# Altium schematic symbol library Hydra_Ref_sch.SCHLIB: 791 symbols (part 1 of 5)
Pins are listed as number, name and electrical type; pins without a type are passive.

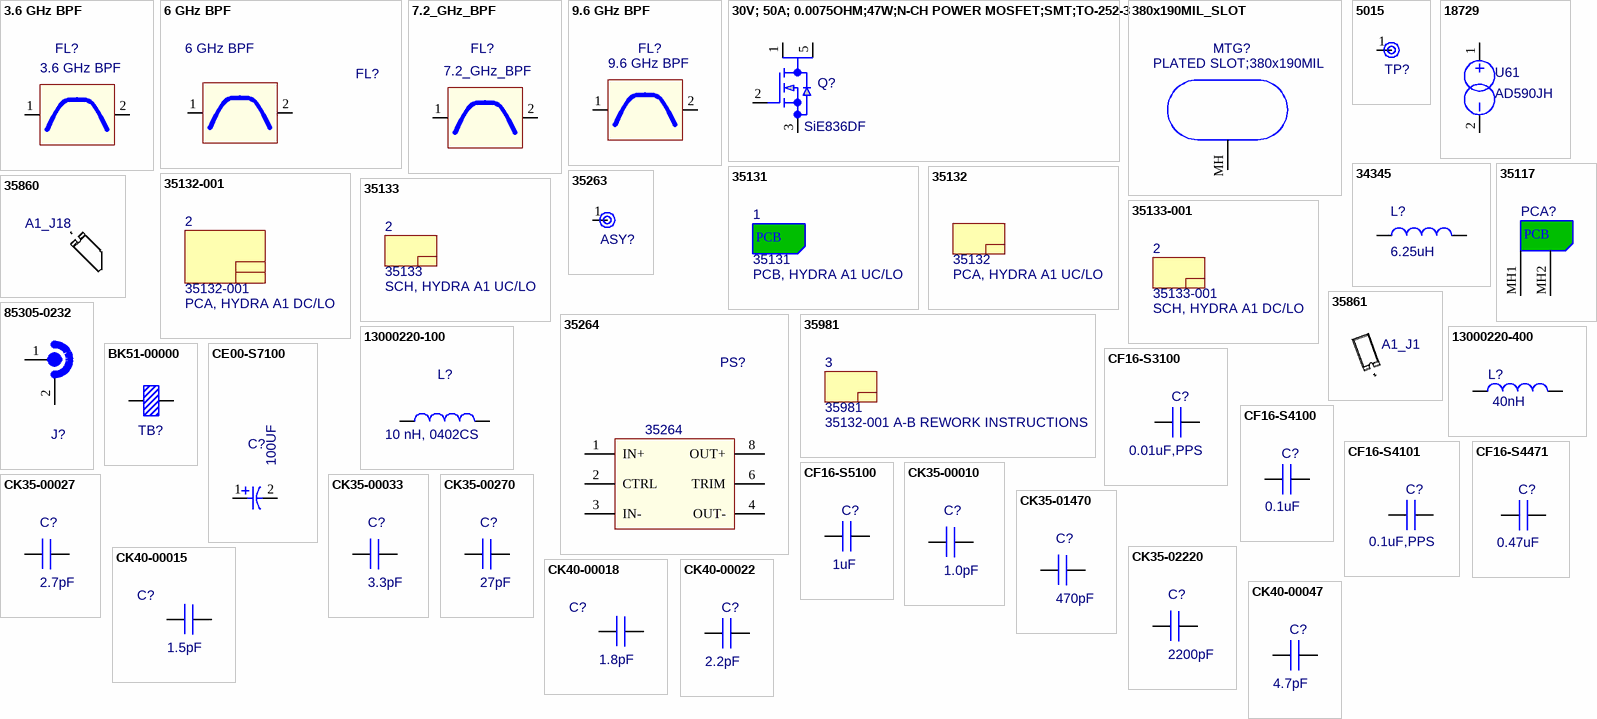
[diagram p0: symbols 3.6 GHz BPF to CK40-00047]

## 3.6 GHz BPF
designator FL?, comment value 3.6 GHz BPF  (hidden comment: MICROSTRIP BPF, 3 TO 4.2 GHz)  (net tie, no BOM)
Approved: CL; NoLoad: .; level: 1; MFGR: N/A; ModifyDate: 5/30/13; M_PN: N/A; G_PN: N/A
footprint 3.6 GHz BPF
footprint 3.6_GHz_BPF
pins: 1 IN, 2 OUT
1 alternate drawing of the same symbol

## 6 GHz BPF
designator FL?  value 6 GHz BPF  (no BOM)
Approved: CL; NoLoad: .; level: 1; MFGR: N/A; ModifyDate: 6/2/13; M_PN: N/A; G_PN: N/A
footprint 6_GHz_BPF_2013-09-30
footprint 6_GHz_BPF_2013-09-30_ALT
pins: 1 IN, 2 OUT
1 alternate drawing of the same symbol

## 7.2_GHz_BPF
designator FL?, comment value 7.2_GHz_BPF  (hidden comment: MICROSTRIP BPF, 7.2 GHz)  (no BOM)
Approved: CL; NoLoad: .; level: 1; MFGR: N/A; ModifyDate: 6/2/13; M_PN: N/A; G_PN: N/A
footprint 7200_MHz_BPF
pins: 1 IN, 2 OUT
1 alternate drawing of the same symbol

## 9.6 GHz BPF
designator FL?  value 9.6 GHz BPF  (no BOM)
Approved: CL; NoLoad: .; level: 1; MFGR: N/A; ModifyDate: 6/2/13; M_PN: N/A; G_PN: N/A
footprint 9.6 GHz_BPF
footprint 9.6_GHz_BPF
pins: 1 IN, 2 OUT
1 alternate drawing of the same symbol

## 30V; 50A; 0.0075OHM;47W;N-CH POWER MOSFET;SMT;TO-252-3
designator Q?, comment M_PN: SiE836DF  (hidden comment: 200V;104W;18.3A;10V VGS ON ;.13 OHM RDS;POLARPAK SMT)
G_PN: QMPP-07503; NoLoad: .; Approved: NM; MFGR: INFINEON; level: 1; ModifyDate: 5/6/13; item_number: QMPP-07503
footprint MOS-SIE836DF (MOSFET)
pins: 1 S, 2 G, 3 D, 5 S

## 380x190MIL_SLOT
designator MTG?, comment PLATED SLOT;380x190MIL  (no BOM)
level: 1; NoLoad: N/L
footprint PLATED SLOT-380x190MIL (PLATED SLOT;380x190MIL)
footprint PLATED_SLOT-380x190MIL
pins: MH

## 5015
designator TP?, comment PCB TEST POINT; SMT; 0.105 x 0.040  (value not drawn)
Value: 5015; MFGR: KEYSTONE; NoLoad: .; Approved: CL; level: 1; M_PN: 5015; ModifyDate: 3/10/12
footprint TP-105x40 (SMT TEST POINT, PAD .105"x.040")
pins: 1

## 18729
designator U61, comment M_PN: AD590JH  (hidden comment: IC; 2-Terminal; Temperature Transducer)
G_PN: 18729; NoLoad: .; Approved: NM; MFGR: ANALOG DEVICES; level: 1; line_number: 1260; ModifyDate: 12/06/12; item_number: 18729
footprint TO-52 (Temperature Transducer, Analog Devices, AD590)
pins: 1 +, 2 -

## 34345
designator L?, comment value 6.25uH  (hidden comment: INDUCTOR;TOROID;6.25 uH;20% @10MHz;.135 OD CORE)
MFGR: GOWANDA; NoLoad: .; Approved: CL; G_PN: 34345; M_PN: custom; level: 1; ModifyDate: 02/22/12; item_number: 34345
footprint IND-TOROIDAL-34345 (.135x.050 toroidan inductor G_PN 34345)
pins: 1, 2

## 35117
designator PCA?  (no BOM)
HYDRA A1-A3 BOARD PCA; level: 1
footprint 35117 (HYDRA A1-A3 BOARD PCA)
pins: MH1 "mounting hole", MH2
text: PCB

## 35131
designator 1  value PCB, HYDRA A1 UC/LO  (hidden comment: 35131)  (mechanical)
PCB, HYDRA A1 UC/LO; NoLoad: .; MFGR: STREAMLINE CIRCUITS; Approved: MH; level: 1; M_PN: 35131; ModifyDate: 2016-03-18; line_number: 1; item_number: 35131
text: PCB

## 35132
designator ?  value PCA, HYDRA A1 UC/LO  item_number: 35132  (mechanical)
PCA, HYDRA A1 UC/LO; NoLoad: .; level: 0; line_number: 0

## 35132-001
designator 2  value PCA, HYDRA A1 DC/LO  (hidden comment: 35132-001)
PCA, HYDRA A1 DC/LO; NoLoad: .; level: 1; item_number: 35132-001; G_PN: 35132-001

## 35133
designator 2  value SCH, HYDRA A1 UC/LO  (hidden comment: 35133)  (mechanical)
SCH, HYDRA A1 UC/LO; NoLoad: .; level: 1; line_number: 2; item_number: 35133

## 35133-001
designator 2  value SCH, HYDRA A1 DC/LO  (hidden comment: 35133-001)  (mechanical)
SCH, HYDRA A1 DC/LO; NoLoad: .; level: 1; line_number: 2; item_number: 35133-001

## 35263
designator ASY?, comment ASSY,HYDRA A2-A1 SHOCK MOUNTED OSCILLATOR  (value not drawn)
Value: 35263; NoLoad: .; Approved: CL; level: 1; ModifyDate: 3/10/12
footprint OCXO assy (Assy only)
footprint OCXO ASSY-NO DIM
footprint OCXO_ASSY
pins: 1

## 35264
designator PS?, comment G_PN: 35264  (hidden comment: ZP00-01502 (DC-DC Converter) Assembly)
MFGR: Giga-tronics; Approved: CL; NoLoad: .; Value: 35264; level: 1; ModifyDate: 5/26/12; M_PN: 35264; item_number: 35264
footprint CONV-ULS-15/2-D48N-C (1.3x0.9x.036" convetor -muRata)
footprint CONV-ULS-15_2-D48N-C
pins: 1 IN+, 2 CTRL, 3 IN-, 4 OUT-, 6 TRIM, 8 OUT+

## 35860
designator A1_J18  (mechanical)
SHIELD,HYDRA,A1-J18; MFGR: Any; Approved: MH; NoLoad: .; G_PN: 35860; Value: 35860; level: 1; ModifyDate: 08/28/15; M_PN: Any; item_number: 35860
footprint 35860 (SHIELD,HYDRA,A1-J18)

## 35861
designator A1_J1  (mechanical)
SHIELD,HYDRA,A1-J1; MFGR: Any; Approved: MH; NoLoad: .; G_PN: 35861; Value: 35861; level: 1; ModifyDate: 08/28/15; M_PN: Any; item_number: 35861
footprint 35861 (SHIELD,HYDRA,A1-J1)

## 35981
designator 3  value 35132-001 A-B REWORK INSTRUCTIONS  (hidden comment: 35981)  (mechanical)
35132-001 A-B REWORK INSTRUCTIONS; NoLoad: .; level: 1; line_number: 3; item_number: 35981

## 85305-0232
designator J?  (value not drawn)
SMB;M;PCB;.197X.197X.161;SURF MT; MFGR: MOLEX; Approved: CL; NoLoad: .; level: 1; Value: 85305-0232; M_PN: 85305-0232; ModifyDate: 4/5/12
footprint CONN-85305-0232 (SMP PLUG SMT MOLEX)
pins: 1 CNTR, 2 GND

## 13000220-100
designator L?, comment value 10 nH, 0402CS  (hidden comment: INDUCTOR,10 NH SM 0402 PKG)
MFGR: Coilcraft; NoLoad: .; Approved: NM; M_PN: 0402CS-10NXGLU; G_PN: 13000220-100; level: 1; ModifyDate: 11/17/12; item_number: 13000220-100
footprint IND-0402-RF (0402 COILCRAFT IND)
pins: 1, 2

## 13000220-400
designator L?, comment value 40nH  (hidden comment: INDUCTOR,40 NH SM 0402 PKG)
G_PN: 13000220-400; M_PN: 0402CS-40NXGLU; MFGR: COILCRAFT; NoLoad: .; Approved: CL; level: 1; ModifyDate: 7/2/13; item_number: 13000220-400
footprint IND-0402CS (Coilcraft 0402CS SM Inductor 47X25X26(mil))
pins: 1, 2

## BK51-00000
designator TB?, comment THERMAL BRIDGE, AlN, 1010  (value not drawn)
G_PN: BK51-00000; Approved: CL; NoLoad: .; MFGR: ANY; M_PN: BT31010WA; level: 1; ModifyDate: 6-28-13; Value: N/A; item_number: BK51-00000
footprint TB-1010-N (METRIC 3225)
pins: 1, 2

## CE00-S7100
designator C?  value 100UF  (hidden comment: CE00-S7100)
CAP ALUM 100UF 100V 20% SMD; NoLoad: .; M_PN: EEVFK2A101M; level: 1; ModifyDate: KS; G_PN: CE00-S7100; item_number: CE00-S7100
footprint CAPB3528-REVA_CT20-S6221[RF-1]()
footprint CAP-FK-TYPE-V
pins: 1 POS, 2 NEG

## CF16-S3100
designator C?, comment value 0.01uF,PPS  (hidden comment: 01UF; 5%; 16V;STACKED METALLIZED PPS FILM;0805)
G_PN: CF16-S3100; Approved: CL; NoLoad: .; MFGR: PANASONIC; M_PN: ECH-U1C103JX5; level: 1; ModifyDate: 03/26/12; item_number: CF16-S3100
footprint CAP-0805-N
pins: 1, 2

## CF16-S4100
designator C?, comment value 0.1uF  (hidden comment: .1UF;5%;16V;STACKED METALIZED PPS FILM;1210)
G_PN: CF16-S4100; Approved: CL; NoLoad: .; MFGR: PANASONIC; M_PN: ECH-U1C104JX5; level: 1; ModifyDate: 4/11/12; item_number: CF16-S4100
footprint CAP-1210-N
pins: 1, 2

## CF16-S4101
designator C?, comment value 0.1uF,PPS  (hidden comment: .1UF;20%;16V;LOW ESR;STACKED METALLIZED PLASTIC FILM;0805)
G_PN: CF16-S4101; Approved: CL; NoLoad: .; MFGR: PANASONIC; M_PN: ECP-U1C104MA5; level: 1; ModifyDate: 4/11/12; item_number: CF16-S4101
footprint CAP-0805-N
pins: 1, 2

## CF16-S4471
designator C?, comment value 0.47uF  (hidden comment: .47UF;20%;16V;METALLIZED PPS FILM; SMT;1206)
NoLoad: .; G_PN: CF16-S4471; MFGR: PANASONIC; Approved: CL; M_PN: ECP-U1C474MA5; level: 1; ModifyDate: 4/11/12; item_number: CF16-S4471
footprint CAP-1206-N (CAP, 1206)
pins: 1, 2

## CF16-S5100
designator C?, comment value 1uF  (hidden comment: 1UF; 20%; 16V; PPS FILM; SMT; 1210)
NoLoad: .; G_PN: CF16-S5100; M_PN: ECP-U1C105MA5; MFGR: PANASONIC; Approved: CL; level: 1; ModifyDate: 02/22/12; item_number: CF16-S5100
footprint CAP-1210-N (METRIC 3225)
pins: 1, 2

## CK35-00010
designator C?, comment value 1.0pF  (hidden comment: 1.0pF;5%;COG;50V;CHIP;0201)
G_PN: CK35-00010; Approved: CL; NoLoad: .; MFGR: VENKEL; M_PN: C0201C0G500-1R0BNP; level: 1; ModifyDate: 7/23/13; item_number: CK35-00010
footprint CAP-0201-N (Metric 1005)
pins: 1, 2

## CK35-00027
designator C?, comment value 2.7pF  (hidden comment: 2.7pF;5%;COG;50V;CHIP;0201)
G_PN: CK35-00027; Approved: CL; NoLoad: .; MFGR: VENKEL; M_PN: C0201C0G500-2R7BNP; level: 1; ModifyDate: 6/13/13; item_number: CK35-00027
footprint CAP-0201-N (Metric 1005)
pins: 1, 2

## CK35-00033
designator C?, comment value 3.3pF  (hidden comment: 3.3pF;5%;COG;50V;CHIP;0201)
G_PN: CK35-00033; Approved: CL; NoLoad: .; MFGR: VENKEL; M_PN: C0201C0G500-3R3BNP; level: 1; ModifyDate: 6/24/13; item_number: CK35-00033
footprint CAP-0201-N (Metric 1005)
pins: 1, 2

## CK35-00270
designator C?, comment value 27pF  (hidden comment: 27 PF,5% TOL;C0G;50V,CHIP;0201)
G_PN: CK35-00270; Approved: CL; NoLoad: .; MFGR: VENKEL; M_PN: C0201C0G500-270JNP; level: 1; ModifyDate: 8/2/13; item_number: CK35-00270
footprint CAP-0201-N (Metric 1005)
pins: 1, 2

## CK35-01470
designator C?, comment value 470pF  (hidden comment: 470 PF,+/-5%;X7R;25V,CHIP;0201)
G_PN: CK35-01470; Approved: CL; NoLoad: .; MFGR: VENKEL; M_PN: C0201X7R250-471JNP; level: 1; ModifyDate: 7/23/13; item_number: CK35-01470
footprint CAP-0201-N (Metric 1005)
pins: 1, 2

## CK35-02220
designator C?, comment value 2200pF  (hidden comment: 2200 PF,+/-5%;X7R;25V,CHIP;0201)
G_PN: CK35-02220; Approved: CL; NoLoad: .; MFGR: VENKEL; M_PN: C0201X7R250-222JNP; level: 1; ModifyDate: 7/23/13; item_number: CK35-02220
footprint CAP-0201-N (Metric 1005)
pins: 1, 2

## CK40-00015
designator C?, comment value 1.5pF  (hidden comment: 1.5pF;5%;COG;50V;CHIP;0402)
G_PN: CK40-00015; Approved: NM; NoLoad: .; MFGR: ANY; level: 1; ModifyDate: 04/06/12; M_PN: ANY; item_number: CK40-00015
footprint CAP-0402-N (0402 Footprint)
pins: 1, 2

## CK40-00018
designator C?, comment value 1.8pF  (hidden comment: 1.8pF;5%;COG;50V;CHIP;0402)
G_PN: CK40-00018; Approved: NM; NoLoad: .; MFGR: ANY; level: 1; ModifyDate: 09/19/12; M_PN: ANY; item_number: CK40-00018
footprint CAP-0402-N (0402 Footprint)
pins: 1, 2

## CK40-00022
designator C?, comment value 2.2pF  (hidden comment: 2.2pF;5%;COG;50V;CHIP;0402)
G_PN: CK40-00022; Approved: CL; NoLoad: .; MFGR: ANY; level: 1; ModifyDate: 04/11/12; M_PN: ANY; item_number: CK40-00022
footprint CAP-0402-N (0402 Footprint)
pins: 1, 2

## CK40-00047
designator C?, comment value 4.7pF  (hidden comment: 4.7pF;5%;COG;50V;CHIP;0402)
MFGR: ANY; Approved: CL; NoLoad: .; G_PN: CK40-00047; level: 1; ModifyDate: 3/24/12; M_PN: ANY; item_number: CK40-00047
footprint CAP-0402-N (0402 Footprint)
pins: 1, 2

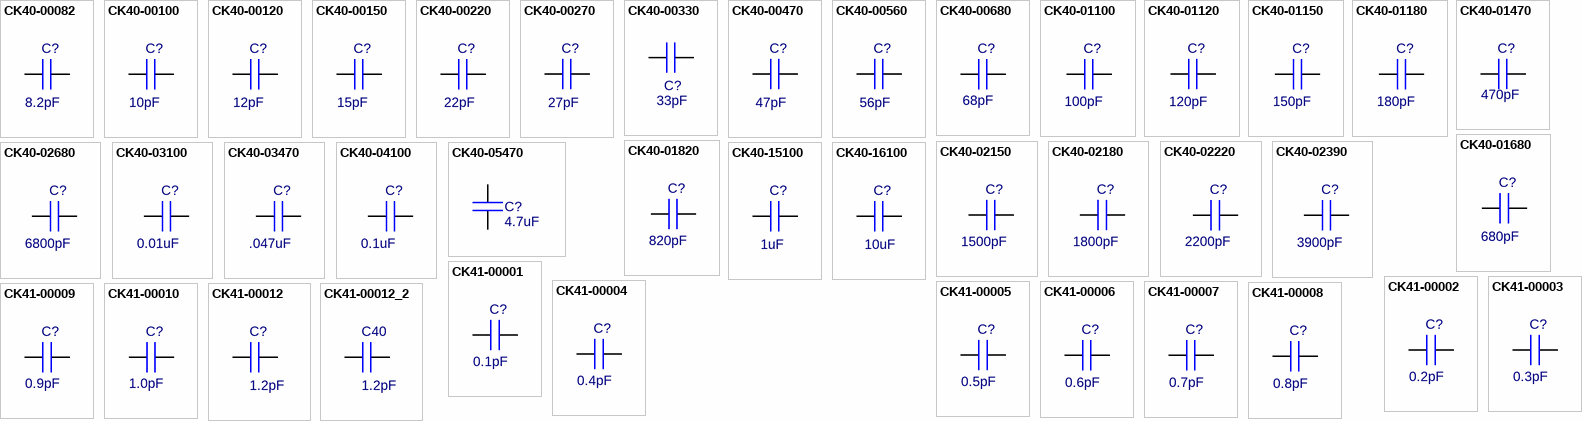
[diagram p1: symbols CK40-00082 to CK41-00012_2]

## CK40-00082
designator C?, comment value 8.2pF  (hidden comment: 8.2 PF,+/-0.25pF;C0G;50V,CHIP;0402)
MFGR: ANY; Approved: NM; NoLoad: .; G_PN: CK40-00082; level: 1; ModifyDate: 11/12/12; M_PN: ANY; item_number: CK40-00082
footprint CAP-0402-N (0402 Footprint)
pins: 1, 2

## CK40-00100
designator C?, comment value 10pF  (hidden comment: 10 PF;5%;COG;>50V;CHIP;0402)
G_PN: CK40-00100; NoLoad: .; MFGR: ANY; Approved: CL; level: 1; ModifyDate: 4/9/12; M_PN: ANY; item_number: CK40-00100
footprint CAP-0402-N (0402 Footprint)
pins: 1, 2

## CK40-00120
designator C?, comment value 12pF  (hidden comment: 12 PF;5%;COG;>50V;CHIP;0402)
G_PN: CK40-00120; NoLoad: .; MFGR: ANY; Approved: CL; level: 1; ModifyDate: 10/06/12; M_PN: ANY; item_number: CK40-00120
footprint CAP-0402-N (0402 Footprint)
pins: 1, 2

## CK40-00150
designator C?, comment value 15pF  (hidden comment: 15 PF;5%;COG;>50V;CHIP;0402)
MFGR: ANY; Approved: CL; NoLoad: .; G_PN: CK40-00150; level: 1; ModifyDate: 4/9/12; M_PN: ANY; item_number: CK40-00150
footprint CAP-0402-N (0402 Footprint)
pins: 1, 2

## CK40-00220
designator C?, comment value 22pF  (hidden comment: 22 PF;5%;COG;>50V;CHIP;0402)
G_PN: CK40-00220; Approved: CL; NoLoad: .; MFGR: ANY; level: 1; ModifyDate: 02/22/12; M_PN: ANY; item_number: CK40-00220
footprint CAP-0402-N (0402 Footprint)
pins: 1, 2

## CK40-00270
designator C?, comment value 27pF  (hidden comment: 27 PF;5%;COG;>50V;CHIP;0402)
G_PN: CK40-00270; Approved: CL; MFGR: ANY; NoLoad: .; level: 1; ModifyDate: 02/22/12; M_PN: ANY; item_number: CK40-00270
footprint CAP-0402-N (0402 Footprint)
pins: 1, 2

## CK40-00330
designator C?, comment value 33pF  (hidden comment: 33 PF;5%;COG;>50V;CHIP;0402)
G_PN: CK40-00330; Approved: CL; MFGR: ANY; NoLoad: .; level: 1; ModifyDate: 3/9/13; M_PN: ANY; item_number: CK40-00330
footprint CAP-0402-N (0402 Footprint)
pins: 1, 2

## CK40-00470
designator C?, comment value 47pF  (hidden comment: 47pF;5%;COG;50V;CHIP;0402)
G_PN: CK40-00470; Approved: NM; NoLoad: .; MFGR: ANY; level: 1; ModifyDate: 04/06/12; M_PN: ANY; item_number: CK40-00470
footprint CAP-0402-N (0402 Footprint)
pins: 1, 2

## CK40-00560
designator C?, comment value 56pF  (hidden comment: 56pF;5%;COG;50V;CHIP;0402)
G_PN: CK40-00560; Approved: NM; NoLoad: .; MFGR: ANY; level: 1; ModifyDate: 6/10/13; M_PN: ANY; item_number: CK40-00560
footprint CAP-0402-N (0402 Footprint)
pins: 1, 2

## CK40-00680
designator C?, comment value 68pF  (hidden comment: 68pF;5%;COG;50V;CHIP;0402)
G_PN: CK40-00680; NoLoad: .; Approved: CL; MFGR: ANY; level: 1; ModifyDate: 02/22/12; M_PN: ANY; item_number: CK40-00680
footprint CAP-0402-N (0402 Footprint)
pins: 1, 2

## CK40-01100
designator C?, comment value 100pF  (hidden comment: 100 PF;5%;COG;>50V;CHIP;0402)
MFGR: Any; Approved: CL; NoLoad: .; G_PN: CK40-01100; level: 1; ModifyDate: 3/21/12; M_PN: Any; item_number: CK40-01100
footprint CAP-0402-N (0402 Footprint)
pins: 1, 2

## CK40-01120
designator C?, comment value 120pF  (hidden comment: 120pF;5%;COG;50V;CHIP;0402)
G_PN: CK40-01120; NoLoad: .; Approved: CL; MFGR: ANY; level: 1; ModifyDate: 04/11/12; M_PN: ANY; item_number: CK40-01120
footprint CAP-0402-N (0402 Footprint)
pins: 1, 2

## CK40-01150
designator C?, comment value 150pF  (hidden comment: 150 PF;5%;COG;>50V;CHIP;0402)
MFGR: Any; Approved: CL; NoLoad: .; G_PN: CK40-01150; level: 1; ModifyDate: 2/1/14; M_PN: Any; item_number: CK40-01150
footprint CAP-0402-N (0402 Footprint)
pins: 1, 2

## CK40-01180
designator C?, comment value 180pF  (hidden comment: 180 PF;5%;COG;>50V;CHIP;0402)
MFGR: Any; Approved: CL; NoLoad: .; G_PN: CK40-01180; level: 1; ModifyDate: 3/21/12; M_PN: Any; item_number: CK40-01180
footprint CAP-0402-N (0402 Footprint)
pins: 1, 2

## CK40-01470
designator C?, comment value 470pF  (hidden comment: 470 PF;5%;COG;>50V;CHIP;0402)
MFGR: Any; Approved: CL; NoLoad: .; G_PN: CK40-01470; level: 1; ModifyDate: 02/22/12; M_PN: Any; item_number: CK40-01470
footprint CAP-0402-N (0402 Footprint)
pins: 1, 2

## CK40-01680
designator C?, comment value 680pF  (hidden comment: 680 PF;5%;COG;>50V;CHIP;0402)
G_PN: CK40-01680; Approved: CL; MFGR: Any; NoLoad: .; level: 1; ModifyDate: 02/22/12; M_PN: Any; item_number: CK40-01680
footprint CAP-0402-N (0402 Footprint)
pins: 1, 2

## CK40-01820
designator C?, comment value 820pF  (hidden comment: 820 PF;5%;COG;>50V;CHIP;0402)
MFGR: Any; Approved: CL; NoLoad: .; G_PN: CK40-01820; level: 1; ModifyDate: 3/23/12; M_PN: Any; item_number: CK40-01820
footprint CAP-0402-N (0402 Footprint)
pins: 1, 2

## CK40-02150
designator C?, comment value 1500pF  (hidden comment: 1500 PF;5%;X7R>50V;CHIP;0402)
MFGR: Any; Approved: CL; NoLoad: .; G_PN: CK40-02150; level: 1; ModifyDate: 4/11/12; M_PN: Any; item_number: CK40-02150
footprint CAP-0402-N (0402 Footprint)
pins: 1, 2

## CK40-02180
designator C?, comment value 1800pF  (hidden comment: 1800 PF;5%;X7R>50V;CHIP;0402)
G_PN: CK40-02180; Approved: CL; NoLoad: .; MFGR: Any; level: 1; ModifyDate: 02/22/12; M_PN: Any; item_number: CK40-02180
footprint CAP-0402-N (0402 Footprint)
pins: 1, 2

## CK40-02220
designator C?, comment value 2200pF  (hidden comment: 2200 PF;5%;X7R>50V;CHIP;0402)
G_PN: CK40-02220; NoLoad: .; Approved: CL; MFGR: Any; level: 1; ModifyDate: 02/22/12; M_PN: Any; item_number: CK40-02220
footprint CAP-0402-N (0402 Footprint)
pins: 1, 2

## CK40-02390
designator C?, comment value 3900pF  (hidden comment: 3900 PF;5%;X7R>50V;CHIP;0402)
G_PN: CK40-02390; Approved: CL; MFGR: Any; NoLoad: .; level: 1; ModifyDate: 02/22/12; M_PN: Any; item_number: CK40-02390
footprint CAP-0402-N (0402 Footprint)
pins: 1, 2

## CK40-02680
designator C?, comment value 6800pF  (hidden comment: 6800 PF;5%;X7R>50V;CHIP;0402)
G_PN: CK40-02680; Approved: CL; MFGR: Any; NoLoad: .; level: 1; ModifyDate: 5/6/13; M_PN: Any; item_number: CK40-02680
footprint CAP-0402-N (0402 Footprint)
pins: 1, 2

## CK40-03100
designator C?, comment value 0.01uF  (hidden comment: 01UF;10%;X7R;>50V;CHIP;0402)
G_PN: CK40-03100; Approved: CL; MFGR: AVX; M_PN: 04025C103KAT2A; NoLoad: .; level: 1; ModifyDate: 4/26/13; item_number: CK40-03100
footprint CAP-0402-N (0402 Footprint)
pins: 1, 2

## CK40-03470
designator C?, comment value .047uF  (hidden comment: .047 UF,10%;X7R;16V,CHIP;0402)
G_PN: CK40-03470; Approved: CL; MFGR: VENKEL; M_PN: C0402X7R160-473KNP; NoLoad: .; level: 1; ModifyDate: 4/30/13; item_number: CK40-03470
footprint CAP-0402-N (0402 Footprint)
pins: 1, 2

## CK40-04100
designator C?, comment value 0.1uF  (hidden comment: .1 UF,10%;X7R;16V,CHIP;0402)
G_PN: CK40-04100; Approved: CL; MFGR: VENKEL; M_PN: C0402X7R160-104KNP; NoLoad: .; level: 1; ModifyDate: 3/29/13; item_number: CK40-04100
footprint CAP-0402-N (0402 Footprint)
pins: 1, 2

## CK40-05470
designator C?, comment value 4.7uF  (hidden comment: 4.7 uF,10%;X5R;6.3V,CHIP;0402)
G_PN: CK40-05470; NoLoad: .; MFGR: VENKEL; M_PN: C0402X5R6R3-475KNP; level: 1; ModifyDate: 6/27/13; item_number: CK40-05470
footprint CAP-0402-N (0402 Footprint)
pins: 1, 2

## CK40-15100
designator C?, comment value 1uF  (hidden comment: 1UF;10%;X5R;16V;CHIP CERAMIC;0402)
G_PN: CK40-15100; Approved: CL; MFGR: VENKEL; M_PN: C0402X5R160-105KNP; NoLoad: .; level: 1; ModifyDate: 4/23/13; item_number: CK40-15100
footprint CAP-0402-N (0402 Footprint)
pins: 1, 2

## CK40-16100
designator C?, comment value 10uF  (hidden comment: 10UF;20%;X5R;10V;CHIP CERAMIC;0402)
G_PN: CK40-16100; Approved: CL; MFGR: VENKEL; M_PN: CL05A106MP5NUNC; NoLoad: .; level: 1; ModifyDate: 7/10/14; item_number: CK40-16100
footprint CAP-0402-N (0402 Footprint)
pins: 1, 2

## CK41-00001
designator C?, comment value 0.1pF  (hidden comment: .1 PF;200V;.05PF;HIGH Q;SMT;CERAMIC;0402)
G_PN: CK41-00001; Approved: CL; NoLoad: .; M_PN: 600L0R1AT200; MFGR: ATC; level: 1; ModifyDate: 8/19/14; item_number: CK41-00001
footprint CAP-0402-N (Metric 1005)
footprint CAP-0402-RF
pins: 1, 2

## CK41-00002
designator C?, comment value 0.2pF  (hidden comment: .2 PF;200V;.05PF;HIGH Q;SMT;CERAMIC;0402)
G_PN: CK41-00002; Approved: CL; NoLoad: .; M_PN: 600L0R2AT200; MFGR: ATC; level: 1; ModifyDate: 02/14/13; item_number: CK41-00002
footprint CAP-0402-N (Metric 1005)
footprint CAP-0402-RF
pins: 1, 2

## CK41-00003
designator C?, comment value 0.3pF  (hidden comment: .3 PF 200V .05PF HIGH Q SMT 0402)
G_PN: CK41-00003; Approved: CL; NoLoad: .; M_PN: 600L0R3AT200T; MFGR: ATC; level: 1; ModifyDate: 01/23/14; item_number: CK41-00003
footprint CAP-0402-N (Metric 1005)
footprint CAP-0402-RF
pins: 1, 2

## CK41-00004
designator C?, comment value 0.4pF  (hidden comment: .4 PF;200V;.05PF;HIGH Q;SMT;CERAMIC;0402)
G_PN: CK41-00004; Approved: CL; NoLoad: .; M_PN: 600L0R4AT200; MFGR: ATC; level: 1; ModifyDate: 02/14/13; item_number: CK41-00004
footprint CAP-0402-N (Metric 1005)
footprint CAP-0402-RF
pins: 1, 2

## CK41-00005
designator C?, comment value 0.5pF  (hidden comment: .5 PF;200V;.05PF;HIGH Q;SMT;CERAMIC;0402)
G_PN: CK41-00005; Approved: CL; NoLoad: .; M_PN: 600L0R5AT200; MFGR: ATC; level: 1; ModifyDate: 02/22/12; item_number: CK41-00005
footprint CAP-0402-N (Metric 1005)
footprint CAP-0402-RF
pins: 1, 2

## CK41-00006
designator C?, comment value 0.6pF  (hidden comment: .6 PF;200V;.05PF;HIGH Q;SMT;CERAMIC;0402)
G_PN: CK41-00006; Approved: CL; NoLoad: .; M_PN: 600L0R6AT200; MFGR: ATC; level: 1; ModifyDate: 02/22/12; item_number: CK41-00006
footprint CAP-0402-N (Metric 1005)
footprint CAP-0402-RF
pins: 1, 2

## CK41-00007
designator C?, comment value 0.7pF  (hidden comment: .7 PF;200V;.05PF;HIGH Q;SMT;CERAMIC;0402)
G_PN: CK41-00007; Approved: CL; NoLoad: .; M_PN: 600L0R7AT200; MFGR: ATC; level: 1; ModifyDate: 4/9/13; item_number: CK41-00007
footprint CAP-0402-N (Metric 1005)
footprint CAP-0402-RF
pins: 1, 2

## CK41-00008
designator C?, comment value 0.8pF  (hidden comment: .8 PF;200V;.05PF;HIGH Q;SMT;CERAMIC;0402)
G_PN: CK41-00008; Approved: CL; NoLoad: .; M_PN: 600L0R8AT200; MFGR: ATC; level: 1; ModifyDate: 02/22/12; item_number: CK41-00008
footprint CAP-0402-N (Metric 1005)
footprint CAP-0402-RF
pins: 1, 2

## CK41-00009
designator C?, comment value 0.9pF  (hidden comment: .9 PF;200V;.05PF;HIGH Q;SMT;CERAMIC;0402)
G_PN: CK41-00009; Approved: CL; NoLoad: .; M_PN: 600L0R9AT200; MFGR: ATC; level: 1; ModifyDate: 02/22/12; item_number: CK41-00009
footprint CAP-0402-N (Metric 1005)
footprint CAP-0402-RF
pins: 1, 2

## CK41-00010
designator C?, comment value 1.0pF  (hidden comment: 1.0 PF;200V;.05PF;HIGH Q;SMT;CERAMIC;0402)
G_PN: CK41-00010; Approved: CL; NoLoad: .; M_PN: 600L1R0AT200; MFGR: ATC; level: 1; ModifyDate: 3/7/13; item_number: CK41-00010
footprint CAP-0402-N (Metric 1005)
footprint CAP-0402-RF
pins: 1, 2

## CK41-00012
designator C?  value 1.2pF
1.2 PF;200V;.05PF;HIGH Q;SMT;CERAMIC;0402; G_PN: CK41-00012; Approved: CL; NoLoad: .; M_PN: 600L1R2AT200; MFGR: ATC; level: 1; line_number: 195; ModifyDate: 02/22/13; item_number: CK41-00012
footprint CAP-0402-N (Metric 1005)
footprint CAP-0402-RF
pins: 1, 2

## CK41-00012_2
designator C40, comment value 1.2pF  (hidden comment: 1.2 PF;200V;.05PF;HIGH Q;SMT;CERAMIC;0402)
G_PN: CK41-00012; Approved: CL; NoLoad: .; M_PN: 600L1R2AT200; MFGR: ATC; level: 1; line_number: 195; ModifyDate: 02/22/13; item_number: CK41-00012
footprint CAP-0402-N (Metric 1005)
footprint CAP-0402-RF
pins: 1, 2

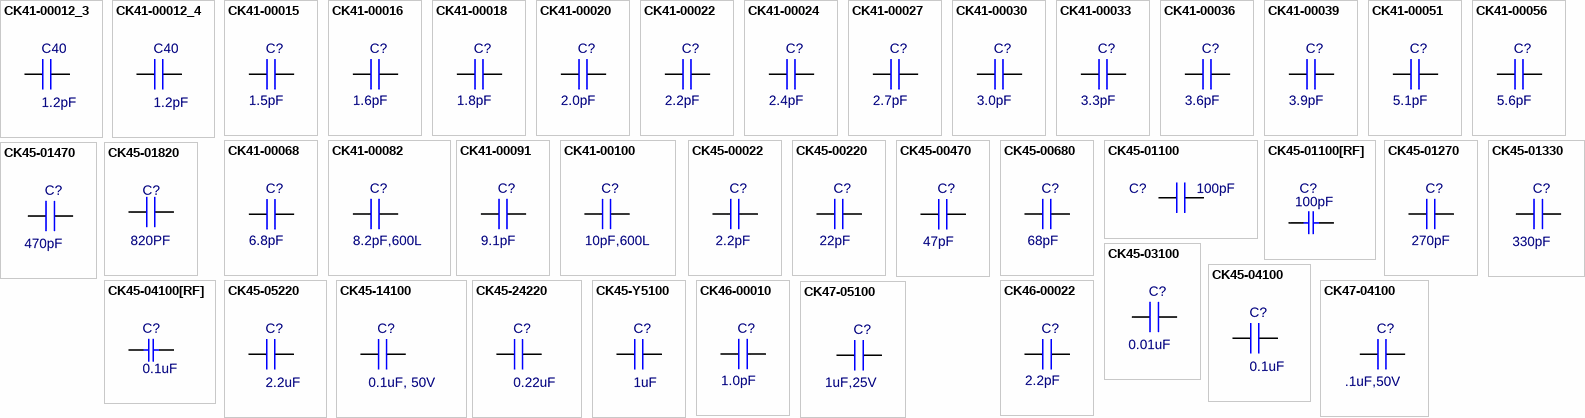
[diagram p2: symbols CK41-00012_3 to CK47-05100]

## CK41-00012_3
designator C40, comment value 1.2pF  (hidden comment: 1.2 PF;200V;.05PF;HIGH Q;SMT;CERAMIC;0402)
G_PN: CK41-00012; Approved: CL; NoLoad: .; M_PN: 600L1R2AT200; MFGR: ATC; level: 1; line_number: 195; ModifyDate: 02/22/13; item_number: CK41-00012
footprint CAP-0402-N (Metric 1005)
footprint CAP-0402-RF
pins: 1, 2

## CK41-00012_4
designator C40, comment value 1.2pF  (hidden comment: 1.2 PF;200V;.05PF;HIGH Q;SMT;CERAMIC;0402)
G_PN: CK41-00012; Approved: CL; NoLoad: .; M_PN: 600L1R2AT200; MFGR: ATC; level: 1; line_number: 195; ModifyDate: 02/22/13; item_number: CK41-00012
footprint CAP-0402-N (Metric 1005)
footprint CAP-0402-RF
pins: 1, 2

## CK41-00015
designator C?, comment value 1.5pF  (hidden comment: 1.5 PF;200V;.05PF;HIGH Q;SMT;CERAMIC;0402)
G_PN: CK41-00015; Approved: CL; NoLoad: .; M_PN: 600L1R5AT200; MFGR: ATC; level: 1; ModifyDate: 02/09/13; item_number: CK41-00015
footprint CAP-0402-N (Metric 1005)
footprint CAP-0402-RF
pins: 1, 2

## CK41-00016
designator C?, comment value 1.6pF  (hidden comment: 1.6 PF;200V;.05PF;HIGH Q;SMT;CERAMIC;0402)
G_PN: CK41-00016; Approved: CL; NoLoad: .; M_PN: 600L1R6AT200; MFGR: ATC; level: 1; ModifyDate: 4/15/13; item_number: CK41-00016
footprint CAP-0402-N (Metric 1005)
footprint CAP-0402-RF
pins: 1, 2

## CK41-00018
designator C?, comment value 1.8pF  (hidden comment: 1.8 PF;200V;.05PF;HIGH Q;SMT;CERAMIC;0402)
G_PN: CK41-00018; Approved: CL; NoLoad: .; M_PN: 600L1R8AT200; MFGR: ATC; level: 1; ModifyDate: 02/09/13; item_number: CK41-00018
footprint CAP-0402-N (Metric 1005)
footprint CAP-0402-RF
pins: 1, 2

## CK41-00020
designator C?, comment value 2.0pF  (hidden comment: 2.0 PF;200V;.05PF;HIGH Q;SMT;CERAMIC;0402)
G_PN: CK41-00020; Approved: CL; NoLoad: .; M_PN: ATC600L2R0AT200T; MFGR: ATC; level: 1; ModifyDate: 4/1/13; item_number: CK41-00020
footprint CAP-0402-N (Metric 1005)
footprint CAP-0402-RF
pins: 1, 2

## CK41-00022
designator C?, comment value 2.2pF  (hidden comment: 2.2 PF;200V;.05PF;HIGH Q;SMT;CERAMIC;0402)
G_PN: CK41-00022; Approved: CL; NoLoad: .; M_PN: ATC600L2R2AT200T; MFGR: ATC; level: 1; ModifyDate: 4/5/13; item_number: CK41-00022
footprint CAP-0402-N (Metric 1005)
footprint CAP-0402-RF
pins: 1, 2

## CK41-00024
designator C?, comment value 2.4pF  (hidden comment: 2.4 PF;200V;.05PF;HIGH Q;SMT;CERAMIC;0402)
G_PN: CK41-00024; Approved: CL; NoLoad: .; M_PN: 600L2R4AT200; MFGR: ATC; level: 1; ModifyDate: 02/09/13; item_number: CK41-00024
footprint CAP-0402-N (Metric 1005)
footprint CAP-0402-RF
pins: 1, 2

## CK41-00027
designator C?, comment value 2.7pF  (hidden comment: 2.7 PF;200V;.05PF;HIGH Q;SMT;CERAMIC;0402)
G_PN: CK41-00027; Approved: CL; NoLoad: .; M_PN: 600L2R7AT200; MFGR: ATC; level: 1; ModifyDate: 4/15/13; item_number: CK41-00027
footprint CAP-0402-N (Metric 1005)
footprint CAP-0402-RF
pins: 1, 2

## CK41-00030
designator C?, comment value 3.0pF  (hidden comment: 3.0 PF;200V;.05PF;HIGH Q;SMT;CERAMIC;0402)
G_PN: CK41-00030; Approved: CL; NoLoad: .; M_PN: 600L3R0AT200; MFGR: ATC; level: 1; ModifyDate: 02/22/12; item_number: CK41-00030
footprint CAP-0402-N (Metric 1005)
footprint CAP-0402-RF
pins: 1, 2

## CK41-00033
designator C?, comment value 3.3pF  (hidden comment: 3.3 PF 200V .05PF HIGH Q SMT 0402)
G_PN: CK41-00033; Approved: CL; NoLoad: .; M_PN: 600L3R3AT200; MFGR: ATC; level: 1; ModifyDate: 3/4/13; item_number: CK41-00033
footprint CAP-0402-N (Metric 1005)
footprint CAP-0402-RF
pins: 1, 2

## CK41-00036
designator C?, comment value 3.6pF  (hidden comment: 3.6 PF 200V .05PF HIGH Q SMT 0402)
G_PN: CK41-00036; Approved: CL; NoLoad: .; M_PN: 600L3R6AT200; MFGR: ATC; level: 1; ModifyDate: 3/5/13; item_number: CK41-00036
footprint CAP-0402-N (Metric 1005)
footprint CAP-0402-RF
pins: 1, 2

## CK41-00039
designator C?, comment value 3.9pF  (hidden comment: 3.9 PF 200V .05PF HIGH Q SMT 0402)
G_PN: CK41-00039; Approved: CL; NoLoad: .; M_PN: 600L3R9AT200; MFGR: ATC; level: 1; ModifyDate: 3/5/13; item_number: CK41-00039
footprint CAP-0402-N (Metric 1005)
footprint CAP-0402-RF
pins: 1, 2

## CK41-00051
designator C?, comment value 5.1pF  (hidden comment: 5.1 PF;200V;.1PF;HIGH Q;SMT;CERAMIC;0402)
G_PN: CK41-00051; Approved: CL; NoLoad: .; M_PN: 600L5R1BT200; MFGR: ATC; level: 1; ModifyDate: 4/5/13; item_number: CK41-00051
footprint CAP-0402-N (Metric 1005)
footprint CAP-0402-RF
pins: 1, 2

## CK41-00056
designator C?, comment value 5.6pF  (hidden comment: 5.6 PF;200V;.1PF;HIGH Q;SMT;CERAMIC;0402)
G_PN: CK41-00056; Approved: CL; NoLoad: .; M_PN: 600L5R6BT200; MFGR: ATC; level: 1; ModifyDate: 3/11/13; item_number: CK41-00056
footprint CAP-0402-N (Metric 1005)
footprint CAP-0402-RF
pins: 1, 2

## CK41-00068
designator C?, comment value 6.8pF  (hidden comment: 6.8 PF;200V;.1PF;HIGH Q;SMT;CERAMIC;0402)
G_PN: CK41-00068; Approved: CL; NoLoad: .; M_PN: 600L6R8BT200; MFGR: ATC; level: 1; ModifyDate: 02/22/12; item_number: CK41-00068
footprint CAP-0402-N (Metric 1005)
footprint CAP-0402-RF
pins: 1, 2

## CK41-00082
designator C?, comment value 8.2pF,600L  (hidden comment: 8.2 PF;200V;.1PF;HIGH Q;SMT;CERAMIC;0402)
G_PN: CK41-00082; Approved: CL; NoLoad: .; M_PN: 600L8R2BT200; MFGR: ATC; level: 1; ModifyDate: 4/23/12; item_number: CK41-00082
footprint CAP-0402-N (Metric 1005)
footprint CAP-0402-RF
pins: 1, 2

## CK41-00091
designator C?, comment value 9.1pF  (hidden comment: 9.1 PF;200V;.1PF;HIGH Q;SMT;CERAMIC;0402)
G_PN: CK41-00091; Approved: CL; NoLoad: .; M_PN: 600L9R1BT200; MFGR: ATC; level: 1; ModifyDate: 3/221/12; item_number: CK41-00091
footprint CAP-0402-N (Metric 1005)
footprint CAP-0402-RF
pins: 1, 2

## CK41-00100
designator C?, comment value 10pF,600L  (hidden comment: 10 PF; 200V; 2%; HIGH Q; SMT; CERAMIC; 0402)
G_PN: CK41-00100; Approved: CL; NoLoad: .; MFGR: ATC; M_PN: 600L100GT200; level: 1; ModifyDate: 02/22/12; item_number: CK41-00100
footprint CAP-0402-N (Metric 1005)
footprint CAP-0402-RF
pins: 1, 2

## CK45-00022
designator C?, comment value 2.2pF  (hidden comment: 2.2 PF;5%;COG;>50V;CHIP;0603)
G_PN: CK45-00022; Approved: CL; NoLoad: .; MFGR: ANY; level: 1; ModifyDate: 08/29/12; M_PN: ANY; item_number: CK45-00022
footprint CAP-0603-N (0603 Footprint)
pins: 1, 2

## CK45-00220
designator C?, comment value 22pF  (hidden comment: 22 PF;5%;COG;>50V;CHIP;0603)
G_PN: CK45-00220; Approved: CL; NoLoad: .; MFGR: ANY; level: 1; ModifyDate: 02/22/12; M_PN: ANY; item_number: CK45-00220
footprint CAP-0603-N (0603 Footprint)
pins: 1, 2

## CK45-00470
designator C?, comment value 47pF  (hidden comment: 47 PF;5%;COG;>50V;CHIP;0603)
MFGR: ANY; Approved: CL; NoLoad: .; G_PN: CK45-00470; level: 1; ModifyDate: 02/22/12; M_PN: ANY; item_number: CK45-00470
footprint CAP-0603-N (0603 Footprint)
pins: 1, 2

## CK45-00680
designator C?, comment value 68pF  (hidden comment: 68 PF;5%;COG;>50V;CHIP;0603)
G_PN: CK45-00680; Approved: NM; NoLoad: .; MFGR: ANY; level: 1; ModifyDate: 11/12/12; M_PN: ANY; item_number: CK45-00680
footprint CAP-0603-N (0603 Footprint)
pins: 1, 2

## CK45-01100
designator C?, comment value 100pF  (hidden comment: 100 PF COG CHIP CERAMIC)
G_PN: CK45-01100; Approved: CL; NoLoad: .; MFGR: ANY; level: 1; ModifyDate: 2/26/13; M_PN: ANY; item_number: CK45-01100
footprint CAP-0603-N (0603 Footprint)
pins: 1, 2

## CK45-01100[RF]
designator C?  value 100pF  (hidden comment: CK45-01100[RF])
100 PF;5%;COG;>50V;CHIP;0603; RF footprint; Approved: NB; NoLoad: .; level: 1; G_PN: CK45-01100; ModifyDate: 02/14/2008 14:07:19; item_number: CK45-01100
footprint CC0603-P
pins: 1, 2

## CK45-01270
designator C?, comment value 270pF  (hidden comment: 270 PF;5%;COG;>50V;CHIP;0603)
G_PN: CK45-01270; Approved: NM; NoLoad: .; MFGR: ANY; level: 1; ModifyDate: 11/11/12; M_PN: ANY; item_number: CK45-01270
footprint CAP-0603-N (0603 Footprint)
pins: 1, 2

## CK45-01330
designator C?, comment value 330pF  (hidden comment: 330 PF;5%;COG;>50V;CHIP;0603)
G_PN: CK45-01330; Approved: CL; NoLoad: .; MFGR: ANY; level: 1; ModifyDate: 4/9/12; M_PN: ANY; item_number: CK45-01330
footprint CAP-0603-N (0603 Footprint)
pins: 1, 2

## CK45-01470
designator C?, comment value 470pF  (hidden comment: 470 PF;5%;COG;>50V;CHIP;0603)
G_PN: CK45-01470; Approved: CL; NoLoad: .; MFGR: ANY; level: 1; ModifyDate: 4/9/12; M_PN: ANY; item_number: CK45-01470
footprint CAP-0603-N (0603 Footprint)
pins: 1, 2

## CK45-01820
designator C?, comment value 820PF  (hidden comment: 820 PF;10%;X7R;>50V;CHIP;0603)
Approved: NM; NoLoad: .; MFGR: ANY; G_PN: CK45-01820; level: 1; ModifyDate: 11/12/12; M_PN: ANY; item_number: CK45-01820
footprint CAP-0603-N (0603 Footprint)
pins: 1, 2

## CK45-03100
designator C?, comment value 0.01uF  (hidden comment: .01 UF;10%;X7R;>50V;CHIP;0603)
G_PN: CK45-03100; Approved: CL; NoLoad: .; MFGR: ANY; level: 1; ModifyDate: 4/9/12; M_PN: ANY; item_number: CK45-03100
footprint CAP-0603-N (0603 Footprint)
pins: 1, 2

## CK45-04100
designator C?, comment value 0.1uF  (hidden comment: .1UF;10%;X7R;16V;CHIP;0603)
G_PN: CK45-04100; Approved: CL; NoLoad: .; MFGR: ANY; level: 1; ModifyDate: 02/22/12; M_PN: ANY; item_number: CK45-04100
footprint CAP-0603-H035-N (Metric 1608)
pins: 1, 2

## CK45-04100[RF]
designator C?  value 0.1uF  (hidden comment: CK45-04100[RF])
.1UF;10%;X7R;16V;CHIP;0603; RF footprint; Approved: NB; NoLoad: .; level: 1; G_PN: CK45-04100; ModifyDate: 02/14/2008 14:07:19; item_number: CK45-04100
footprint CC0603-P
pins: 1, 2

## CK45-05220
designator C?, comment value 2.2uF  (hidden comment: CAP,CHP,2.2UF,10%,X5R;16V)
G_PN: CK45-05220; Approved: CL; NoLoad: .; MFGR: ANY; level: 1; ModifyDate: 4/30/15; M_PN: ANY; item_number: CK45-05220
footprint CAP-0603-H035-N (Metric 1608)
pins: 1, 2

## CK45-14100
designator C?, comment value 0.1uF, 50V  (hidden comment: .1UF;5%;X7R;50V;CHIP;0603)
G_PN: CK45-14100; Approved: CL; NoLoad: .; MFGR: VENKEL; M_PN: C0603X7R500-104JNE; level: 1; ModifyDate: 3/29/13; item_number: CK45-14100
footprint CAP-0603-N (0603 Footprint)
pins: 1, 2

## CK45-24220
designator C?, comment value 0.22uF  (hidden comment: .22UF;10%;X7R;25V;CHIP;0603)
G_PN: CK45-24220; Approved: CL; NoLoad: .; MFGR: TDK; M_PN: C1608X5R1E224K080AA; level: 1; ModifyDate: 4/29/13; item_number: CK45-24220
footprint CAP-0603-N (0603 Footprint)
pins: 1, 2

## CK45-Y5100
designator C?, comment value 1uF  (hidden comment: 1UF;X2Y;20%;10V;X5R;0603)
G_PN: CK45-Y5100; Approved: CL; NoLoad: .; MFGR: JOHANSON DIELECTRICS; M_PN: 100X14X105MV4T; level: 1; ModifyDate: 1/26/14; item_number: CK45-Y5100
footprint CAP-0603-N (0603 Footprint)
pins: 1, 2

## CK46-00010
designator C?, comment value 1.0pF  (hidden comment: 1.0 PF;250V;.05PF;HIGH Q;SMT;CERAMIC;0603)
G_PN: CK46-00010; Approved: CL; NoLoad: .; MFGR: ATC; M_PN: 600S1R0AT250; level: 1; ModifyDate: 02/22/12; item_number: CK46-00010
footprint CAP-0603-N (Metric 1608)
pins: 1, 2

## CK46-00022
designator C?, comment value 2.2pF  (hidden comment: 2.2 PF;250V;.05PF;HIGH Q;SMT;CERAMIC;0603)
G_PN: CK46-00022; Approved: CL; NoLoad: .; M_PN: 600S2R2AT250; MFGR: ATC; level: 1; ModifyDate: 02/22/12; item_number: CK46-00022
footprint CAP-0603-N (Metric 1608)
pins: 1, 2
